# Altium schematic symbol library SCHLIB.SchLib: 2608 symbols (part 5 of 20)
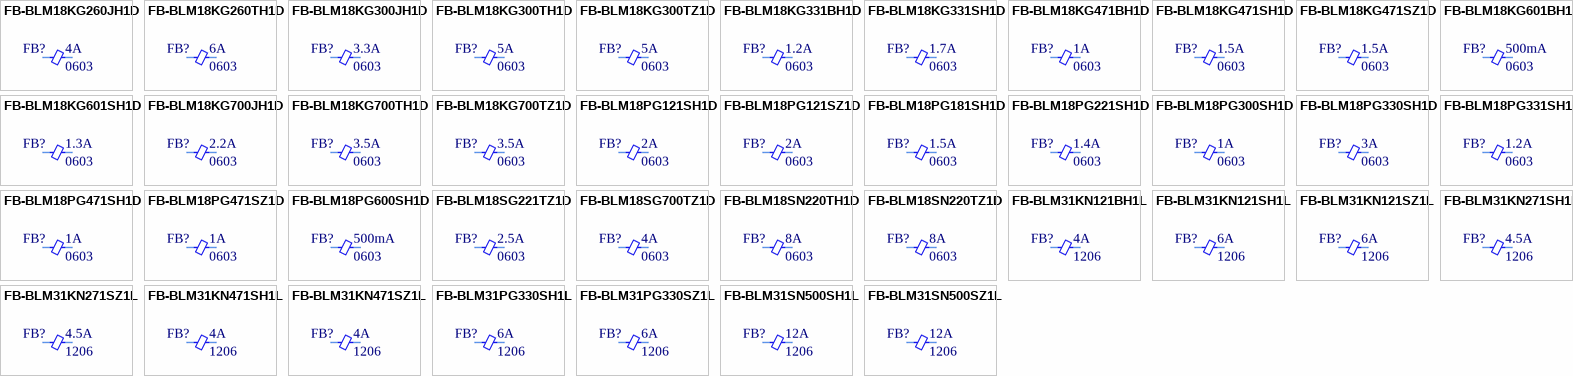
[diagram p87: symbols FB-BLM18KG260JH1D to FB-BLM31SN500SZ1L]

## FB-BLM18PG471SH1D
designator FB?  Current Rating: 1A  Package: 0603
FERRITE BEAD 470 OHM 0603 1LN; Manufacturer Part Number: BLM18PG471SH1D; Manufacturer: Murata Electronics; Filter Type: Power Line; Number of Lines: 1; Impedance @ Frequency: 470 Ohms @ 100 MHz; DCR: 200mOhm; Object  Type: Part; Design Item ID: FB-BLM18PG471SH1D; Series: BLM18; Ratings: AEC-Q200; Operating Temperature: -55°C ~ 125°C; Mounting Type: Surface Mount; Height: 0.95mm; Size: 1.60mm x 0.80mm; Category: Bead
footprint FB0603
pins: 1, 2

## FB-BLM18PG471SZ1D
designator FB?  Current Rating: 1A  Package: 0603
FERRITE BEAD 470 OHM 0603 1LN; Manufacturer Part Number: BLM18PG471SZ1D; Manufacturer: Murata Electronics; Filter Type: Power Line; Number of Lines: 1; Impedance @ Frequency: 470 Ohms @ 100 MHz; DCR: 200mOhm; Object  Type: Part; Design Item ID: FB-BLM18PG471SZ1D; Series: BLM18; Ratings: AEC-Q200; Operating Temperature: -55°C ~ 125°C; Mounting Type: Surface Mount; Height: 0.95mm; Size: 1.60mm x 0.80mm; Category: Bead
footprint FB0603
pins: 1, 2

## FB-BLM18PG600SH1D
designator FB?  Current Rating: 500mA  Package: 0603
FERRITE BEAD 60 OHM 0603 1LN; Manufacturer Part Number: BLM18PG600SH1D; Manufacturer: Murata Electronics; Filter Type: Power Line; Number of Lines: 1; Impedance @ Frequency: 60 Ohms @ 100 MHz; DCR: 100mOhm; Object  Type: Part; Design Item ID: FB-BLM18PG600SH1D; Series: BLM18; Ratings: AEC-Q200; Operating Temperature: -55°C ~ 125°C; Mounting Type: Surface Mount; Height: 0.95mm; Size: 1.60mm x 0.80mm; Category: Bead
footprint FB0603
pins: 1, 2

## FB-BLM18SG221TZ1D
designator FB?  Current Rating: 2.5A  Package: 0603
FERRITE BEAD 220 OHM 0201 1LN; Manufacturer Part Number: BLM18SG221TZ1D; Manufacturer: Murata Electronics; Filter Type: Power Line; Number of Lines: 1; DCR: 40mOhm; Object  Type: Part; Design Item ID: FB-BLM18SG221TZ1D; Series: BLM18; Impedance @ Frequency: -; Ratings: AEC-Q200; Operating Temperature: -55°C ~ 125°C; Mounting Type: Surface Mount; Height: 0.65mm; Size: 1.60mm x 0.80mm; Category: Bead
footprint FB0603
pins: 1, 2

## FB-BLM18SG700TZ1D
designator FB?  Current Rating: 4A  Package: 0603
FERRITE BEAD 70 OHM 0603 1LN; Manufacturer Part Number: BLM18SG700TZ1D; Manufacturer: Murata Electronics; Filter Type: Power Line; Number of Lines: 1; Impedance @ Frequency: 70 Ohms @ 100 MHz; DCR: 20mOhm; Object  Type: Part; Design Item ID: FB-BLM18SG700TZ1D; Series: BLM18; Ratings: AEC-Q200; Operating Temperature: -55°C ~ 125°C; Mounting Type: Surface Mount; Height: 0.65mm; Size: 1.60mm x 0.80mm; Category: Bead
footprint FB0603
pins: 1, 2

## FB-BLM18SN220TH1D
designator FB?  Current Rating: 8A  Package: 0603
FERRITE BEAD 22 OHM 0603 1 LN; Manufacturer Part Number: BLM18SN220TH1D; Manufacturer: Murata Electronics; Filter Type: Power Line; Number of Lines: 1; Impedance @ Frequency: 22 Ohms @ 100 MHz; DCR: 4mOhm; Object  Type: Part; Design Item ID: FB-BLM18SN220TH1D; Series: BLM18; Ratings: AEC-Q200; Operating Temperature: -55°C ~ 125°C; Mounting Type: Surface Mount; Height: 0.75mm; Size: 1.60mm x 0.80mm; Category: Bead
footprint FB0603
pins: 1, 2

## FB-BLM18SN220TZ1D
designator FB?  Current Rating: 8A  Package: 0603
FERRITE BEAD 22 OHM 0603 1 LN; Manufacturer Part Number: BLM18SN220TZ1D; Manufacturer: Murata Electronics; Filter Type: Power Line; Number of Lines: 1; Impedance @ Frequency: 22 Ohms @ 100 MHz; DCR: 4mOhm; Object  Type: Part; Design Item ID: FB-BLM18SN220TZ1D; Series: BLM18; Ratings: AEC-Q200; Operating Temperature: -55°C ~ 125°C; Mounting Type: Surface Mount; Height: 0.75mm; Size: 1.60mm x 0.80mm; Category: Bead
footprint FB0603
pins: 1, 2

## FB-BLM31KN121BH1L
designator FB?  Current Rating: 4A  Package: 1206
FERRITE BEAD 120 OHM 1206 1LN; Manufacturer Part Number: BLM31KN121BH1L; Manufacturer: Murata Electronics; Filter Type: Power Line; Number of Lines: 1; DCR: 9mOhm; Object  Type: Part; Design Item ID: FB-BLM31KN121BH1L; Series: BLM31; Impedance @ Frequency: -; Ratings: AEC-Q200; Operating Temperature: -55°C ~ 150°C; Mounting Type: Surface Mount; Height: 1.80mm; Size: 3.20mm x 1.60mm; Category: Bead
footprint FB1206
pins: 1, 2

## FB-BLM31KN121SH1L
designator FB?  Current Rating: 6A  Package: 1206
FERRITE BEAD 120 OHM 1206 1LN; Manufacturer Part Number: BLM31KN121SH1L; Manufacturer: Murata Electronics; Filter Type: Power Line; Number of Lines: 1; Impedance @ Frequency: 120 Ohms @ 100 MHz; DCR: 20mOhm; Object  Type: Part; Design Item ID: FB-BLM31KN121SH1L; Series: BLM31; Ratings: AEC-Q200; Operating Temperature: -55°C ~ 125°C; Mounting Type: Surface Mount; Height: 1.80mm; Size: 3.20mm x 1.60mm; Category: Bead
footprint FB1206
pins: 1, 2

## FB-BLM31KN121SZ1L
designator FB?  Current Rating: 6A  Package: 1206
FERRITE BEAD 120 OHM 1206 1LN; Manufacturer Part Number: BLM31KN121SZ1L; Manufacturer: Murata Electronics; Filter Type: Power Line; Number of Lines: 1; Impedance @ Frequency: 120 Ohms @ 100 MHz; DCR: 9mOhm; Object  Type: Part; Design Item ID: FB-BLM31KN121SZ1L; Series: BLM31; Ratings: AEC-Q200; Operating Temperature: -55°C ~ 125°C; Mounting Type: Surface Mount; Height: 1.80mm; Size: 3.20mm x 1.60mm; Category: Bead
footprint FB1206
pins: 1, 2

## FB-BLM31KN271SH1L
designator FB?  Current Rating: 4.5A  Package: 1206
FERRITE BEAD 270 OHM 1206 1LN; Manufacturer Part Number: BLM31KN271SH1L; Manufacturer: Murata Electronics; Filter Type: Power Line; Number of Lines: 1; Impedance @ Frequency: 270 Ohms @ 100 MHz; DCR: 16mOhm; Object  Type: Part; Design Item ID: FB-BLM31KN271SH1L; Series: BLM31; Ratings: AEC-Q200; Operating Temperature: -55°C ~ 125°C; Mounting Type: Surface Mount; Height: 1.80mm; Size: 3.20mm x 1.60mm; Category: Bead
footprint FB1206
pins: 1, 2

## FB-BLM31KN271SZ1L
designator FB?  Current Rating: 4.5A  Package: 1206
FERRITE BEAD 270 OHM 1206 1LN; Manufacturer Part Number: BLM31KN271SZ1L; Manufacturer: Murata Electronics; Filter Type: Power Line; Number of Lines: 1; Impedance @ Frequency: 270 Ohms @ 100 MHz; DCR: 16mOhm; Object  Type: Part; Design Item ID: FB-BLM31KN271SZ1L; Series: BLM31; Ratings: AEC-Q200; Operating Temperature: -55°C ~ 125°C; Mounting Type: Surface Mount; Height: 1.80mm; Size: 3.20mm x 1.60mm; Category: Bead
footprint FB1206
pins: 1, 2

## FB-BLM31KN471SH1L
designator FB?  Current Rating: 4A  Package: 1206
FERRITE BEAD 470 OHM 1206 1LN; Manufacturer Part Number: BLM31KN471SH1L; Manufacturer: Murata Electronics; Filter Type: Power Line; Number of Lines: 1; Impedance @ Frequency: 470 Ohms @ 100 MHz; DCR: 20mOhm; Object  Type: Part; Design Item ID: FB-BLM31KN471SH1L; Series: BLM31; Ratings: AEC-Q200; Operating Temperature: -55°C ~ 125°C; Mounting Type: Surface Mount; Height: 1.80mm; Size: 3.20mm x 1.60mm; Category: Bead
footprint FB1206
pins: 1, 2

## FB-BLM31KN471SZ1L
designator FB?  Current Rating: 4A  Package: 1206
FERRITE BEAD 470 OHM 1206 1LN; Manufacturer Part Number: BLM31KN471SZ1L; Manufacturer: Murata Electronics; Filter Type: Power Line; Number of Lines: 1; Impedance @ Frequency: 470 Ohms @ 100 MHz; DCR: 20mOhm; Object  Type: Part; Design Item ID: FB-BLM31KN471SZ1L; Series: BLM31; Ratings: AEC-Q200; Operating Temperature: -55°C ~ 125°C; Mounting Type: Surface Mount; Height: 1.80mm; Size: 3.20mm x 1.60mm; Category: Bead
footprint FB1206
pins: 1, 2

## FB-BLM31PG330SH1L
designator FB?  Current Rating: 6A  Package: 1206
FERRITE BEAD 33 OHM 1206 1LN; Manufacturer Part Number: BLM31PG330SH1L; Manufacturer: Murata Electronics; Filter Type: Power Line; Number of Lines: 1; Impedance @ Frequency: 33 Ohms @ 100 MHz; DCR: 9mOhm; Object  Type: Part; Design Item ID: FB-BLM31PG330SH1L; Series: BLM31; Ratings: AEC-Q200; Operating Temperature: -55°C ~ 125°C; Mounting Type: Surface Mount; Height: 1.30mm; Size: 3.20mm x 1.60mm; Category: Bead
footprint FB1206
pins: 1, 2

## FB-BLM31PG330SZ1L
designator FB?  Current Rating: 6A  Package: 1206
FERRITE BEAD 33 OHM 1206 1LN; Manufacturer Part Number: BLM31PG330SZ1L; Manufacturer: Murata Electronics; Filter Type: Power Line; Number of Lines: 1; Impedance @ Frequency: 33 Ohms @ 100 MHz; DCR: 9mOhm; Object  Type: Part; Design Item ID: FB-BLM31PG330SZ1L; Series: BLM31; Ratings: AEC-Q200; Operating Temperature: -55°C ~ 125°C; Mounting Type: Surface Mount; Height: 1.30mm; Size: 3.20mm x 1.60mm; Category: Bead
footprint FB1206
pins: 1, 2

## FB-BLM31SN500SH1L
designator FB?  Current Rating: 12A  Package: 1206
FERRITE BEAD 50 OHM 1206 1LN; Manufacturer Part Number: BLM31SN500SH1L; Manufacturer: Murata Electronics; Filter Type: Power Line; Number of Lines: 1; Impedance @ Frequency: 50 Ohms @ 100 MHz; DCR: 1.6mOhm; Object  Type: Part; Design Item ID: FB-BLM31SN500SH1L; Series: BLM31; Ratings: AEC-Q200; Operating Temperature: -55°C ~ 125°C; Mounting Type: Surface Mount; Height: 1.30mm; Size: 3.20mm x 1.60mm; Category: Bead
footprint FB1206
pins: 1, 2

## FB-BLM31SN500SZ1L
designator FB?  Current Rating: 12A  Package: 1206
FERRITE BEAD 50 OHM 1206 1LN; Manufacturer Part Number: BLM31SN500SZ1L; Manufacturer: Murata Electronics; Filter Type: Power Line; Number of Lines: 1; Impedance @ Frequency: 50 Ohms @ 100 MHz; DCR: 1.6mOhm; Object  Type: Part; Design Item ID: FB-BLM31SN500SZ1L; Series: BLM31; Ratings: AEC-Q200; Operating Temperature: -55°C ~ 125°C; Mounting Type: Surface Mount; Height: 1.30mm; Size: 3.20mm x 1.60mm; Category: Bead
footprint FB1206
pins: 1, 2

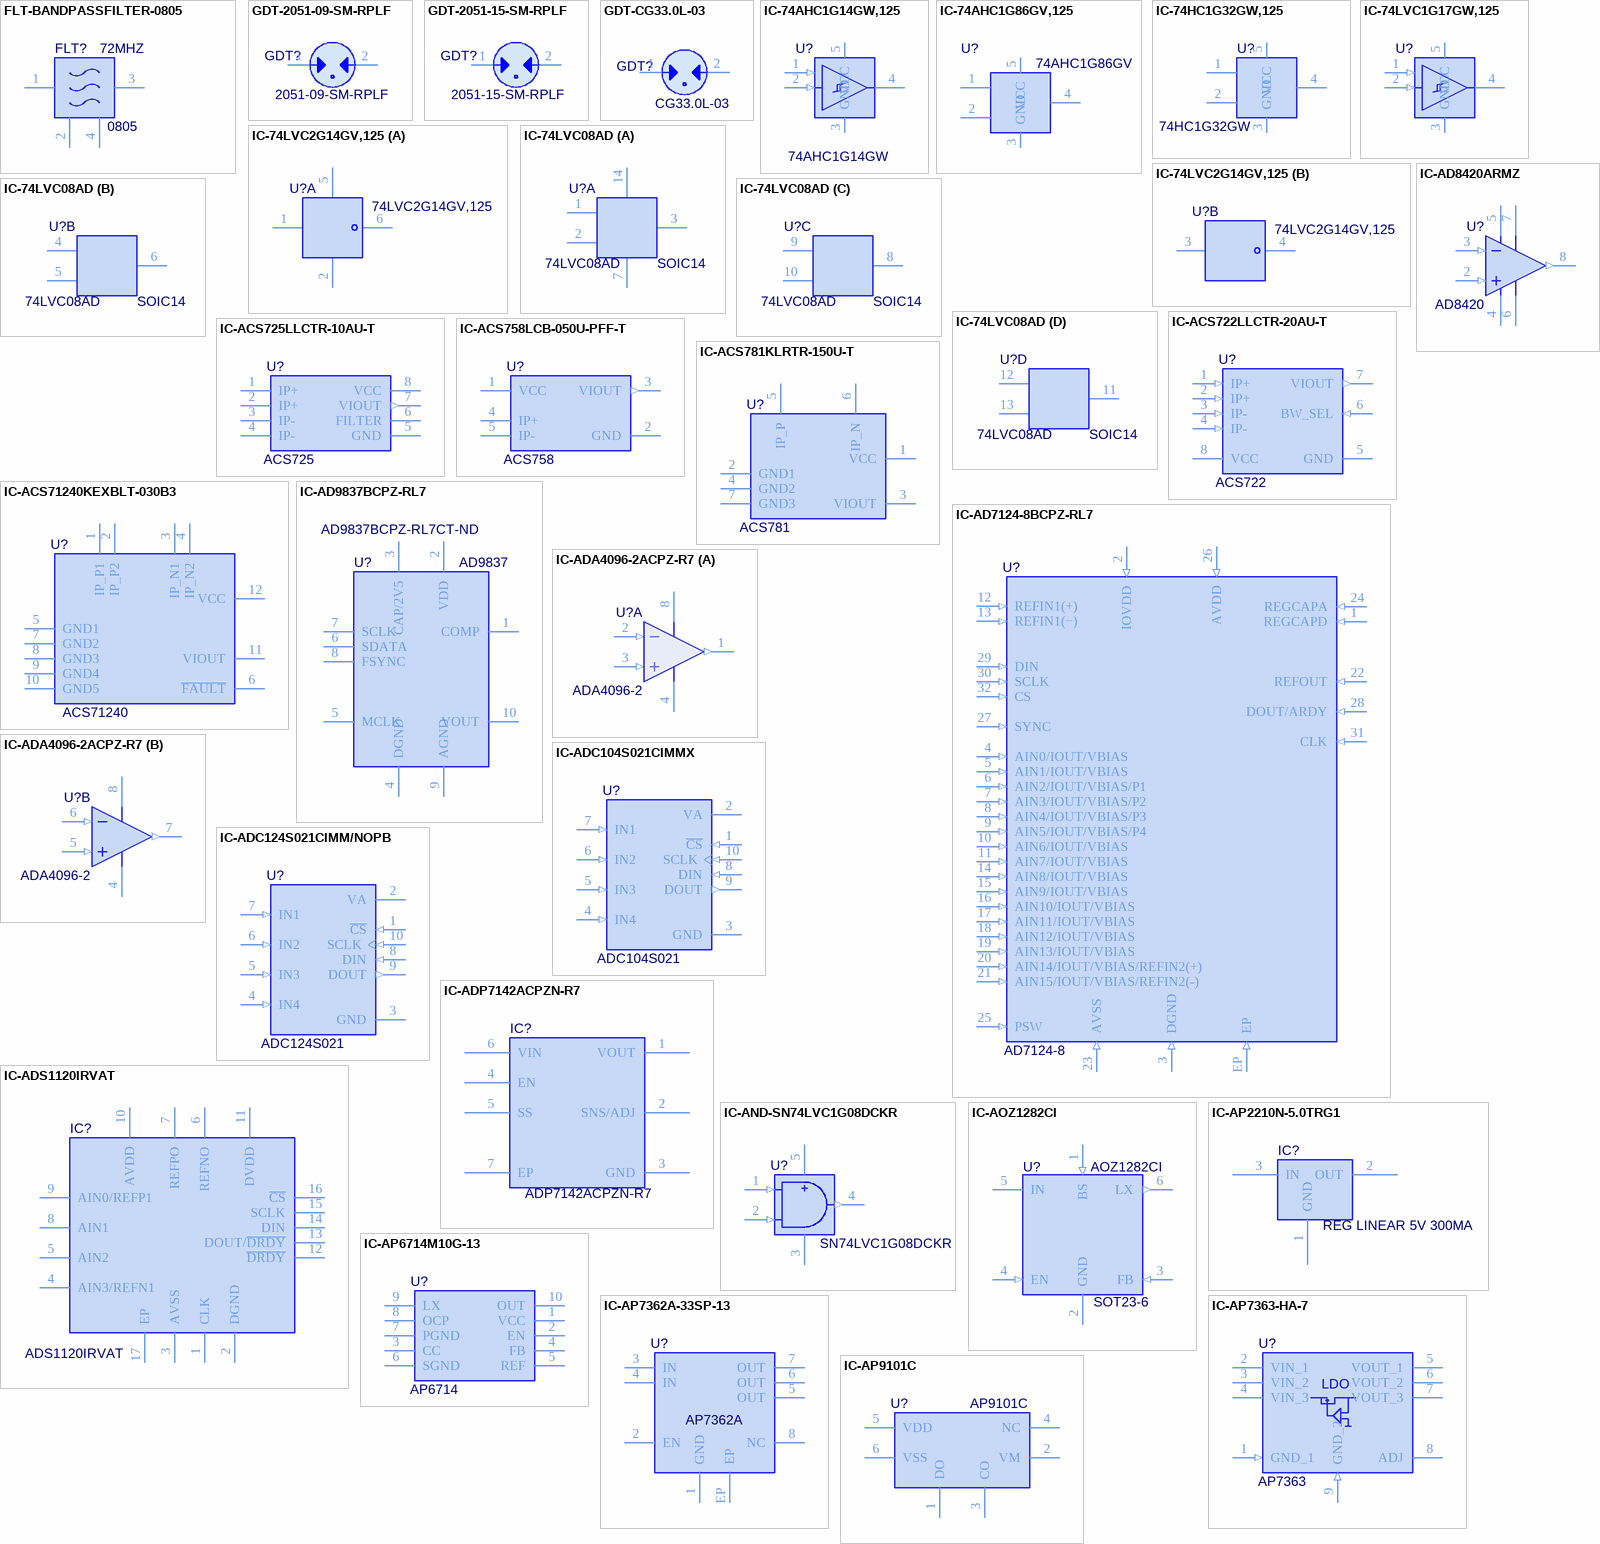
[diagram p16: symbols FLT-BANDPASSFILTER-0805 to IC-AP9101C]

## FLT-BANDPASSFILTER-0805
designator FLT?  Package: 0805  BW: 72MHZ
FILTER BANDPASS WLAN&BLUETOOTH; Manufacturer: TDK; Manufacturer Part Number: DEA202450BT-1294C1-H; Washability: OK; Supplier 1: Digi-Key; Stock 1: 141744; Pricing 1: 1=0.35, 10=0.329, 25=0.314, 50=0.304, 100=0.2938, 250=0.2786, 500=0.23302, 1000=0.18084 (USD); Packaging: Tape and Reel; Package Quantity: 2000; Supplier Part Number 1: 445-172335-6-ND
footprint FILTER-0805
pins: 1, 2, 3, 4

## GDT-2051-09-SM-RPLF
designator GDT?, comment 2051-09-SM-RPLF
GDT 90V 30% 2KA SURFACE MOUNT; Manufacturer: Bourns; Number of Terminals/Pins: 2; Fail Short: No; Peak Pulse Current: 1A; Approvals: UL; Supplier 1: Digi-Key; Supplier Part Number 1: 2051-09-SM-RPLFCT-ND; Manufacturer Part Number: 2051-09-SM-RPLF; Stock: 108797; Pricing: 1=0.72, 5=0.698, 10=0.677, 50=0.5698, 100=0.473, 250=0.43, 500=0.3655, 1000=0.3225 (USD); RoHS: Yes; Mount: Surface Mount; Case/Package: SMD/SMT; Case Code (Metric): 4532; Case Code (Imperial): 1812; Contact Plating: Tin; Min Operating Temperature: -40°C; Max Operating Temperature: 90°C; Packaging: Tape and Reel; Package Quantity: 2500; Termination: SMD/SMT; Tolerance: 30%; Number of Poles: 2; Length: 4.5mm; Height: 2.7mm; Depth: 3.2mm; REACH SVHC: No SVHC; ComponentLink1URL: https://datasheet.ciiva.com/11795/0900766b80f83dcf-11795101.pdf?src-supplier=RSComponents; ComponentLink1Description: https://datasheet.ciiva.com/11795/0900766b80f83dcf-11795101.pdf?src-supplier=RSComponents; ComponentLink2URL: https://datasheet.ciiva.com/1272/1846247-1272737.pdf?src-supplier=Element14; ComponentLink2Description: https://datasheet.ciiva.com/1272/1846247-1272737.pdf?src-supplier=Element14; ComponentLink3URL: https://datasheet.ciiva.com/1273/1846247-1273347.pdf?src-supplier=Element14; ComponentLink3Description: https://datasheet.ciiva.com/1273/1846247-1273347.pdf?src-supplier=Element14; ComponentLink4URL: https://datasheet.ciiva.com/7495/2051-7495226.pdf?src-supplier=Digi-Key; ComponentLink4Description: https://datasheet.ciiva.com/7495/2051-7495226.pdf?src-supplier=Digi-Key; ComponentLink5URL: https://datasheet.ciiva.com/7495/2051-7495231.pdf?src-supplier=Digi-Key; ComponentLink5Description: https://datasheet.ciiva.com/7495/2051-7495231.pdf?src-supplier=Digi-Key
footprint GDT-1812
pins: 1, 2

## GDT-2051-15-SM-RPLF
designator GDT?, comment 2051-15-SM-RPLF
GDT 150V 2KA 2 POLE SMD; Manufacturer: Bourns; Number of Terminals/Pins: 2; Tolerance: 30%; Fail Short: No; Peak Pulse Current: 1A; Supplier 1: Digi-Key; Supplier Part Number 1: 2051-15-SM-RPLFCT-ND; Manufacturer Part Number: 2051-15-SM-RPLF; Stock: 13533; Pricing: 1=0.72, 5=0.698, 10=0.677, 50=0.5698, 100=0.473, 250=0.43, 500=0.3655, 1000=0.3225 (USD); RoHS: Yes; Mount: Surface Mount; Case/Package: SMD/SMT; Contact Plating: Tin; Case Code (Metric): 4532; Case Code (Imperial): 1812; Min Operating Temperature: -40°C; Max Operating Temperature: 90°C; Package Quantity: 1; Packaging: Tape and Reel; Number of Poles: 2; Termination: SMD/SMT; Length: 4.5mm; Height: 2.7mm; Depth: 3.2mm; REACH SVHC: No SVHC; ComponentLink1URL: https://datasheet.ciiva.com/4498/2051-72669-4498899.pdf?src-supplier=Mouser; ComponentLink1Description: https://datasheet.ciiva.com/4498/2051-72669-4498899.pdf?src-supplier=Mouser; ComponentLink2URL: https://datasheet.ciiva.com/11795/0900766b80f83dcf-11795110.pdf?src-supplier=RSComponents; ComponentLink2Description: https://datasheet.ciiva.com/11795/0900766b80f83dcf-11795110.pdf?src-supplier=RSComponents; ComponentLink3URL: https://datasheet.ciiva.com/1272/1846247-1272738.pdf?src-supplier=Element14; ComponentLink3Description: https://datasheet.ciiva.com/1272/1846247-1272738.pdf?src-supplier=Element14; ComponentLink4URL: https://datasheet.ciiva.com/1273/1846247-1273348.pdf?src-supplier=Element14; ComponentLink4Description: https://datasheet.ciiva.com/1273/1846247-1273348.pdf?src-supplier=Element14; ComponentLink5URL: https://datasheet.ciiva.com/7495/2051-7495321.pdf?src-supplier=Digi-Key; ComponentLink5Description: https://datasheet.ciiva.com/7495/2051-7495321.pdf?src-supplier=Digi-Key; ComponentLink6URL: https://datasheet.ciiva.com/7495/2051-7495311.pdf?src-supplier=Digi-Key; ComponentLink6Description: https://datasheet.ciiva.com/7495/2051-7495311.pdf?src-supplier=Digi-Key; ComponentLink7URL: https://datasheet.ciiva.com/7495/2051-7495327.pdf?src-supplier=Digi-Key; ComponentLink7Description: https://datasheet.ciiva.com/7495/2051-7495327.pdf?src-supplier=Digi-Key
footprint GDT-1812
pins: 1, 2

## GDT-CG33.0L-03
designator GDT?, comment CG33.0L-03
GAS DISCHARGE TUBE, 2 POL, 5000A, 4200V; Manufacturer: Littelfuse; Number of Poles: 2; Fail Short: No; Peak Pulse Current: 10A; Insulation Resistance: 10GR; Breakdown Voltage: 3.6kV; Supplier 1: Digi-Key; Supplier Part Number 1: F11238-ND; Manufacturer Part Number: CG33.0L-03; Stock: 262; Pricing: 1=3.66, 5=3.538, 10=3.416, 50=2.684, 100=2.196, 250=2.135 (USD); RoHS: Yes; Mount: Through Hole; Case/Package: Axial; Number of Pins: 2; Min Operating Temperature: -40°C; Max Operating Temperature: 90°C; Packaging: Tray; Package Quantity: 350; Diameter: 8mm; Length: 62mm; REACH SVHC: No SVHC; ComponentLink1URL: https://datasheet.ciiva.com/1272/1142683-1272904.pdf?src-supplier=Element14; ComponentLink1Description: https://datasheet.ciiva.com/1272/1142683-1272904.pdf?src-supplier=Element14; ComponentLink2URL: https://datasheet.ciiva.com/12089/littelfuse-gdt-ac-cg3-series-12089275.pdf?src-supplier=Mouser; ComponentLink2Description: https://datasheet.ciiva.com/12089/littelfuse-gdt-ac-cg3-series-12089275.pdf?src-supplier=Mouser
footprint FP-CG33_0L-03
pins: 1, 2

## IC-74AHC1G14GW,125
designator U?, comment 74AHC1G14GW
IC INVERTER SCHMITT 1CH 5TSSOP; Manufacturer: Nexperia; Manufacturer Part Number: 74AHC1G14GW,125; Washability: OK; Supplier 1: Digi-Key; Supplier Part Number 1: 1727-3149-1-ND; Stock: 5831; Pricing: 1=0.22, 10=0.178, 25=0.1492, 100=0.0944, 250=0.0729, 500=0.0621, 1000=0.0422 (USD); RoHS: No; ComponentLink1URL: http://www.farnell.com/datasheets/2014360.pdf?src-supplier=Farnell; ComponentLink1Description: http://www.farnell.com/datasheets/2014360.pdf?src-supplier=Farnell
footprint TSSOP5 (SOT23, 5-Leads, Body 2.15x1.4mm, Pitch 0.65mm, IPC High Density)
pins: 1 NC (in), 2 A (in), 3 GND, 4 Y (hiz), 5 VCC

## IC-74AHC1G86GV,125
designator U?, comment 74AHC1G86GV
IC GATE XOR 1CH 2-INP 5TSOP; Manufacturer: NXP Semiconductors; Manufacturer Part Number: 74AHC1G86GV,125; Max Supply Voltage: 5.5V; Min Supply Voltage: 2V; Quiescent Current: 1uA; Propagation Delay: 11.5ns; Operating Supply Voltage: 5V; Number of Outputs: 1; Number of Inputs: 2; Low Level Output Current: 8mA; High Level Output Current: -8mA; Washability: OK; Supplier 1: Digi-Key; Stock 1: 0; Mount: Surface Mount; Number of Pins: 5; Contact Plating: Tin; Min Operating Temperature: -40°C; Max Operating Temperature: 125°C; Packaging: Tape and Reel; Package Quantity: 3000; Number of Gates: 1; Number of Input Lines: 2; Number of Output Lines: 1; Number of Circuits: 1; Number of Elements: 1; Turn-On Delay Time: 11.5ns; Radiation Hardening: No; Lead Free: Lead Free; ComponentLink1URL: http://www.nxp.com/documents/data_sheet/74AHC_AHCT1G86.pdf; ComponentLink1Description: http://www.nxp.com/documents/data_sheet/74AHC_AHCT1G86.pdf; ComponentLink2URL: https://www.verical.com/server-webapp/html/getDatasheet?partID=634212; ComponentLink2Description: https://www.verical.com/server-webapp/html/getDatasheet?partID=634212; Supplier Part Number 1: 568-4824-1-ND; Logic Function: XOR; Case/Package: TSOP
footprint TSOP5
pins: 1 B, 2 A, 3 GND, 4 Y, 5 VCC

## IC-74HC1G32GW,125
designator U?, comment 74HC1G32GW
IC GATE OR 1CH 2-INP 5TSSOP; Manufacturer: Nexperia; Manufacturer Part Number: 74HC1G32GW,125; Washability: OK; Supplier 1: Digi-Key; Supplier Part Number 1: 1727-6040-1-ND; Stock 1: 15603; Pricing 1: 1=0.31000, 10=0.25400, 25=0.21240, 100=0.13450, 250=0.10380, 500=0.08846, 1000=0.06015 (USD); RoHS: No; ComponentLink1URL: https://assets.nexperia.com/documents/data-sheet/74HC_HCT1G32.pdf?src-supplier=Digi-Key; ComponentLink1Description: https://assets.nexperia.com/documents/data-sheet/74HC_HCT1G32.pdf?src-supplier=Digi-Key
footprint TSSOP5 (SOT23, 5-Leads, Body 2.15x1.4mm, Pitch 0.65mm, IPC High Density)
pins: 1 B, 2 A, 3 GND, 4 Y, 5 VCC

## IC-74LVC1G17GW,125
designator U?, comment 74LVC1G17GW  (value not drawn)
IC BUF NON-INVERT 5.5V SC70-5; Manufacturer: Nexperia; Manufacturer Part Number: 74LVC1G17GW,125; Washability: OK; ComponentLink1URL: https://datasheet.ciiva.com/15094/getdatasheetpartid-39328-15094090.pdf?src-supplier=Verical; ComponentLink1Description: https://datasheet.ciiva.com/15094/getdatasheetpartid-39328-15094090.pdf?src-supplier=Verical; ComponentLink2URL: https://datasheet.ciiva.com/14303/sn74ahc1g126-14303430.pdf?src-supplier=Avnet; ComponentLink2Description: https://datasheet.ciiva.com/14303/sn74ahc1g126-14303430.pdf?src-supplier=Avnet; ComponentLink3URL: https://datasheet.ciiva.com/41677/1860928-41677366.pdf?src-supplier=Newark; ComponentLink3Description: https://datasheet.ciiva.com/41677/1860928-41677366.pdf?src-supplier=Newark; ComponentLink4URL: https://datasheet.ciiva.com/1833/sn74ahc1g126-1833709.pdf?src-supplier=Digi-Key; ComponentLink4Description: https://datasheet.ciiva.com/1833/sn74ahc1g126-1833709.pdf?src-supplier=Digi-Key; ComponentLink5URL: https://datasheet.ciiva.com/1833/sn74ahc1g126-1833710.pdf?src-supplier=Digi-Key; ComponentLink5Description: https://datasheet.ciiva.com/1833/sn74ahc1g126-1833710.pdf?src-supplier=Digi-Key; ComponentLink6URL: https://datasheet.ciiva.com/14303/sn74ahc1g126-14303431.pdf?src-supplier=Avnet; ComponentLink6Description: https://datasheet.ciiva.com/14303/sn74ahc1g126-14303431.pdf?src-supplier=Avnet; ComponentLink7URL: https://datasheet.ciiva.com/1833/sn74ahc1g126-1833711.pdf?src-supplier=Digi-Key; ComponentLink7Description: https://datasheet.ciiva.com/1833/sn74ahc1g126-1833711.pdf?src-supplier=Digi-Key; Supplier 1: Digi-Key; Supplier Part Number 1: 1727-4117-1-ND; Stock: 89229; Pricing: 1=0.21, 10=0.196, 25=0.1864, 100=0.1065, 250=0.079, 500=0.0656, 1000=0.0447 (USD); RoHS: No; ComponentLink8URL: http://www.farnell.com/datasheets/2185283.pdf?src-supplier=Farnell; ComponentLink8Description: http://www.farnell.com/datasheets/2185283.pdf?src-supplier=Farnell; ComponentLink9URL: https://assets.nexperia.com/documents/data-sheet/74LVC1G17.pdf?src-supplier=Digi-Key; ComponentLink9Description: https://assets.nexperia.com/documents/data-sheet/74LVC1G17.pdf?src-supplier=Digi-Key
footprint TSSOP5 (SOT23, 5-Leads, Body 2.15x1.4mm, Pitch 0.65mm, IPC High Density)
pins: 1 NC (in), 2 A (in), 3 GND, 4 Y (hiz), 5 VCC

## IC-74LVC2G14GV,125
designator U?, comment 74LVC2G14GV,125
IC DUAL INV SCHMITT-TRIG 6TSOP; Manufacturer: NXP Semiconductors; High Level Output Current: -32mA; Low Level Output Current: 32mA; Min Supply Voltage: 1.65V; Max Supply Voltage: 5.5V; Logic Function: Buffer,Inverter,Schmitt Trigger; Number of Circuits: 2; Quiescent Current: 40uA; Number of Inputs: 1; Propagation Delay: 2.7ns; Turn-On Delay Time: 12ns; Washability: OK; Supplier 1: Digi-Key; Manufacturer Part Number: 74LVC2G14GV,125; Stock 1: 113499; Pricing 1: 1=0.39, 10=0.289, 25=0.2528, 100=0.1636, 250=0.13544, 500=0.10836, 1000=0.08308 (USD); Mount: Surface Mount; Case/Package: TSOP; Number of Pins: 6; Weight: 0.000705oz; Contact Plating: Tin; Min Operating Temperature: -40°C; Max Operating Temperature: 125°C; Packaging: Tape and Reel; Package Quantity: 3000; Number of Elements: 2; Radiation Hardening: No; Lead Free: Lead Free; REACH SVHC: No SVHC; ComponentLink1URL: http://www.nxp.com/documents/data_sheet/74LVC2G14.pdf?src-supplier=Digi-Key; ComponentLink1Description: http://www.nxp.com/documents/data_sheet/74LVC2G14.pdf?src-supplier=Digi-Key; ComponentLink2URL: http://www.mouser.com/ds/2/302/74LVC2G14-839768.pdf?src-supplier=Mouser; ComponentLink2Description: http://www.mouser.com/ds/2/302/74LVC2G14-839768.pdf?src-supplier=Mouser; ComponentLink3URL: https://www.verical.com/server-webapp/html/getDatasheet?partID=388359&src-supplier=Verical; ComponentLink3Description: https://www.verical.com/server-webapp/html/getDatasheet?partID=388359&src-supplier=Verical; ComponentLink4URL: http://www.nxp.com/documents/data_sheet/74LVC2G14.pdf?src-supplier=Avnet; ComponentLink4Description: http://www.nxp.com/documents/data_sheet/74LVC2G14.pdf?src-supplier=Avnet; Supplier Part Number 1: 1727-6088-6-ND
footprint TSOP6
part A pins: 1, 2, 5, 6
part B pins: 3, 4

## IC-74LVC08AD
designator U?, comment 74LVC08AD  Case/Package: SOIC14
IC GATE AND 4CH 2-INP 14SO; Manufacturer: Nexperia; Manufacturer Part Number: 74LVC08AD,118; Min Supply Voltage: 1.65V; Max Supply Voltage: 3.6V; Number of Elements: 4; Propagation Delay: 4.1ns; Number of Inputs: 2; Number of Outputs: 1; Low Level Output Current: 24mA; Quiescent Current: 1uA; High Level Output Current: -24mA; Turn-On Delay Time: 3.9ns; Schmitt Trigger Input: No; Washability: OK; Supplier 1: Digi-Key; Supplier Part Number 1: 1727-3078-6-ND; Stock 1: 12403; Pricing 1: 1=0.35, 10=0.284, 25=0.2596, 100=0.1932, 250=0.17504, 500=0.14486, 1000=0.10865 (USD); Supplier 2: Digi-Key; Supplier Part Number 2: 296-1697-6-ND; Stock 2: 16579; Pricing 2: 1=0.42, 10=0.339, 100=0.2307, 500=0.17304, 1000=0.12978 (USD); Mount: Surface Mount; Number of Pins: 14; Weight: 0.004564oz; Contact Plating: Gold; Min Operating Temperature: -40°C; Max Operating Temperature: 125°C; Logic Function: AND; Packaging: Tape and Reel; Package Quantity: 2500; Number of Gates: 4; Number of Input Lines: 2; Number of Output Lines: 1; Number of Circuits: 4; Number of Bits: 4; Output Current: 24mA; Length: 8.65mm; Height: 1.58mm; Width: 3.91mm; Radiation Hardening: No; Lead Free: Lead Free; REACH SVHC: No SVHC; ComponentLink1URL: http://www.ti.com/general/docs/lit/getliterature.tsp?genericPartNumber=SN54LVC08A&&fileType=pdf&src-supplier=Avnet; ComponentLink1Description: http://www.ti.com/general/docs/lit/getliterature.tsp?genericPartNumber=SN54LVC08A&&fileType=pdf&src-supplier=Avnet; ComponentLink2URL: http://www.ti.com/lit/ds/symlink/sn74lvc08a.pdf?src-supplier=Digi-Key; ComponentLink2Description: http://www.ti.com/lit/ds/symlink/sn74lvc08a.pdf?src-supplier=Digi-Key; ComponentLink3URL: http://www.produktinfo.conrad.com/datenblaetter/1000000-1099999/001017101-da-01-en-IC_QUA_2IN_AND_SN74LVC08ADR_SOIC_14_TID.pdf?src-supplier=Conrad; ComponentLink3Description: http://www.produktinfo.conrad.com/datenblaetter/1000000-1099999/001017101-da-01-en-IC_QUA_2IN_AND_SN74LVC08ADR_SOIC_14_TID.pdf?src-supplier=Conrad; Supplier 3: Digi-Key; Supplier Part Number 3: MC74LCX08DR2GOSDKR-ND; Stock 3: 3791; Pricing 3: 1=0.46, 10=0.373, 100=0.2541, 500=0.19058, 1000=0.14294 (USD); Halogen Free: Halogen Free; ComponentLink4URL: http://www.onsemi.com/pub_link/Collateral/MC74LCX08-D.PDF?src-supplier=Digi-Key; ComponentLink4Description: http://www.onsemi.com/pub_link/Collateral/MC74LCX08-D.PDF?src-supplier=Digi-Key; ComponentLink5URL: https://www.verical.com/server-webapp/html/getDatasheet?partID=53422&src-supplier=Verical; ComponentLink5Description: https://www.verical.com/server-webapp/html/getDatasheet?partID=53422&src-supplier=Verical; ComponentLink6URL: http://www.onsemi.com/pub/Collateral/MC74LCX08-D.PDF?src-supplier=Avnet; ComponentLink6Description: http://www.onsemi.com/pub/Collateral/MC74LCX08-D.PDF?src-supplier=Avnet; ComponentLink7URL: http://www.onsemi.ru.com/pub/Collateral/MC74LCX08-D.PDF?src-supplier=Avnet+Europe; ComponentLink7Description: http://www.onsemi.ru.com/pub/Collateral/MC74LCX08-D.PDF?src-supplier=Avnet+Europe
footprint SOIC14
part A pins: 1 1A, 2 7, 3 8, 7 15 (power), 14 (power)
part B pins: 4 1A, 5 7, 6 8
part C pins: 8, 9 1A, 10 7
part D pins: 11 8, 12 1A, 13 7

## IC-ACS722LLCTR-20AU-T
designator U?, comment ACS722
SENSOR CURRENT HALL 20A DC; Manufacturer: Allegro MicroSystems; Manufacturer Part Number: ACS722LLCTR-20AU-T; Number of Channels: 1; Frequency: 80kHz; Response Time: 5us; Max Supply Current: 12mA; Polarity: Unidirectional; Linearity: 1%; Accuracy: 3%; Quiescent Current: 9mA; Sensitivity: 132mV/A; Supplier 1: Digi-Key; Supplier Part Number 1: 620-1638-1-ND; Stock: 8629; Pricing: 1=4.46, 5=3.94, 10=3.479, 25=2.8228, 50=2.4948, 100=2.4291, 500=2.0352, 1000=1.9039 (USD); RoHS: Yes; Case/Package: SOIC; Number of Pins: 8; Min Operating Temperature: -40°C; Max Operating Temperature: 150°C; Packaging: Tape and Reel; Bandwidth: 80kHz; Current Sensing: 20A; ComponentLink1URL: http://www.allegromicro.com/~/media/Files/Datasheets/ACS722-Datasheet.ashx?src-supplier=Digi-Key; ComponentLink1Description: http://www.allegromicro.com/~/media/Files/Datasheets/ACS722-Datasheet.ashx?src-supplier=Digi-Key; ComponentLink2URL: https://www.allegromicro.com/~/media/Files/Datasheets/ACS722-Datasheet.ashx?src-supplier=Digi-Key; ComponentLink2Description: https://www.allegromicro.com/~/media/Files/Datasheets/ACS722-Datasheet.ashx?src-supplier=Digi-Key
footprint SOIC8
pins: 1 IP+ (in) "Terminals for current being sensed; fused internally", 2 IP+ (in) "Terminals for current being sensed; fused internally", 3 IP- (in) "Terminals for current being sensed; fused internally", 4 IP- (in) "Terminals for current being sensed; fused internally", 5 GND (power) "Signal ground terminal", 6 BW_SEL (in) "Terminal for selecting 20 kHz or 80 kHz bandwidth", 7 VIOUT (out) "Analog output signal", 8 VCC (power) "Device power supply terminal"

## IC-ACS725LLCTR-10AU-T
designator U?, comment ACS725
SENSOR CURRENT HALL 10A DC; Manufacturer: Allegro MicroSystems; Manufacturer Part Number: ACS725LLCTR-10AU-T; Number of Channels: 1; Frequency: 120kHz; Response Time: 4us; Max Supply Current: 14mA; Polarity: Unidirectional; Linearity: 1.5%; Accuracy: 0.9%; Sensitivity: 264mV/A; Quiescent Current: 10mA; Supplier 1: Digi-Key; Supplier Part Number 1: 620-1723-1-ND; Stock: 6672; Pricing: 1=4.89, 5=4.318, 10=3.813, 25=3.094, 50=2.7342, 100=2.6622, 500=2.2305, 1000=2.0866 (USD); RoHS: Yes; Mount: Surface Mount; Case/Package: SOIC; Number of Pins: 8; Min Operating Temperature: -40°C; Max Operating Temperature: 150°C; Packaging: Tape and Reel; Current Sensing: 10A; Bandwidth: 120kHz; ComponentLink1URL: http://www.allegromicro.com/~/media/Files/Datasheets/ACS725-Datasheet.ashx?src-supplier=Digi-Key; ComponentLink1Description: http://www.allegromicro.com/~/media/Files/Datasheets/ACS725-Datasheet.ashx?src-supplier=Digi-Key; ComponentLink2URL: https://www.allegromicro.com/~/media/Files/Datasheets/ACS725-Datasheet.ashx?src-supplier=Digi-Key; ComponentLink2Description: https://www.allegromicro.com/~/media/Files/Datasheets/ACS725-Datasheet.ashx?src-supplier=Digi-Key
footprint SOIC8
pins: 1 IP+, 2 IP+, 3 IP-, 4 IP-, 5 GND (power), 6 FILTER (power), 7 VIOUT (out), 8 VCC (power)

## IC-ACS758LCB-050U-PFF-T
designator U?, comment ACS758
SENSOR CURRENT HALL 50A DC; Manufacturer: Allegro MicroSystems; Manufacturer Part Number: ACS758LCB-050U-PFF-T; Max Supply Current: 13.5mA; Operating Supply Voltage: 5V; Output Current: 1mA; Sensitivity: 60mV/A; Linearity: 1%; Accuracy: 2%; Response Time: 4us; Min Supply Voltage: 3V; Polarity: Unidirectional; Quiescent Current: 10mA; Max Supply Voltage: 5.5V; Bandwidth: 120kHz; Number of Channels: 1; Supplier 1: Digi-Key; Supplier Part Number 1: 620-1353-ND; Stock: 4212; Pricing: 1=7.18, 5=6.3, 10=5.67, 25=5.04, 50=4.662, 100=4.032, 500=3.78, 1000=3.528, 5000=3.3516 (USD); RoHS: Yes; Mount: Through Hole; Number of Pins: 5; Min Operating Temperature: -40°C; Max Operating Temperature: 150°C; Current Sensing: 50A; Packaging: Rail/Tube; Package Quantity: 34; Frequency: 120kHz; Length: 10mm; Width: 13mm; Height: 7mm; Radiation Hardening: No; REACH SVHC: No SVHC; ComponentLink1URL: https://datasheet.ciiva.com/15099/getdatasheetpartid-322787-15099480.pdf?src-supplier=Verical; ComponentLink1Description: https://datasheet.ciiva.com/15099/getdatasheetpartid-322787-15099480.pdf?src-supplier=Verical; ComponentLink2URL: https://datasheet.ciiva.com/1165/acs758-datasheet-1165148.pdf?src-supplier=Element14; ComponentLink2Description: https://datasheet.ciiva.com/1165/acs758-datasheet-1165148.pdf?src-supplier=Element14; ComponentLink3URL: https://datasheet.ciiva.com/25911/acs758-datasheet-25911676.pdf?src-supplier=Avnet+Europe; ComponentLink3Description: https://datasheet.ciiva.com/25911/acs758-datasheet-25911676.pdf?src-supplier=Avnet+Europe; ComponentLink4URL: https://datasheet.ciiva.com/3271/acs756-datasheet-3271997.pdf?src-supplier=Avnet; ComponentLink4Description: https://datasheet.ciiva.com/3271/acs756-datasheet-3271997.pdf?src-supplier=Avnet
footprint FP-CB-PFF-5-MFG
pins: 1 VCC (power), 2 GND (power), 3 VIOUT (out), 4 IP+, 5 IP-

## IC-ACS781KLRTR-150U-T
designator U?, comment ACS781
THERMALLY ENHANCED CURRENT SENSO; Manufacturer: Allegro MicroSystems; Manufacturer Part Number: ACS781KLRTR-150U-T; Polarity: Unidirectional; Current Sensing: 100A; Number of Channels: 1; Sensitivity: 8.8mV/A; Frequency: 120kHz; Linearity: 1%; Accuracy: 0.8%; Response Time: 3.6us; Max Supply Current: 15mA; Supplier 1: Digi-Key; Supplier Part Number 1: 620-1851-1-ND; Stock: 5352; Pricing: 1=4.79, 5=4.23, 10=3.737, 25=3.0316, 50=2.679, 100=2.6085, 500=2.1855, 1000=2.0445 (USD); RoHS: No; Mount: Surface Mount; Min Operating Temperature: -40°C; Max Operating Temperature: 125°C; Packaging: Tape and Reel; ComponentLink1URL: https://www.allegromicro.com/~/media/Files/Datasheets/ACS781-Datsaheet.ashx?src-supplier=Digi-Key; ComponentLink1Description: https://www.allegromicro.com/~/media/Files/Datasheets/ACS781-Datsaheet.ashx?src-supplier=Digi-Key
pins: 1 VCC, 2 GND1, 3 VIOUT, 4 GND2, 5 IP_P, 6 IP_N, 7 GND3

## IC-ACS71240KEXBLT-030B3
designator U?, comment ACS71240
AUTOMOTIVE-GRADE, GALVANICALLY I; Manufacturer: Allegro MicroSystems; Manufacturer Part Number: ACS71240KEXBLT-030B3; Supplier 1: Digi-Key; Supplier Part Number 1: 620-2049-1-ND; Stock: 5177; Pricing: 1=2.19, 5=2.072, 10=1.776, 25=1.4208, 50=1.3024, 100=1.184, 500=1.036 (USD); RoHS: No; ComponentLink1Description: datasheet; ComponentLink1URL: https://www.allegromicro.com/~/media/Files/Datasheets/ACS71240-Data-Sheet.ashx
pins: 1 IP_P1, 2 IP_P2, 3 IP_N1, 4 IP_N2, 5 GND1, 6 ~{FAULT}, 7 GND2, 8 GND3, 9 GND4, 10 GND5, 11 VIOUT, 12 VCC

## IC-AD7124-8BCPZ-RL7
designator U?, comment AD7124-8